# Altium integrated library 00Lib.IntLib: 286 symbols (part 2 of 2)
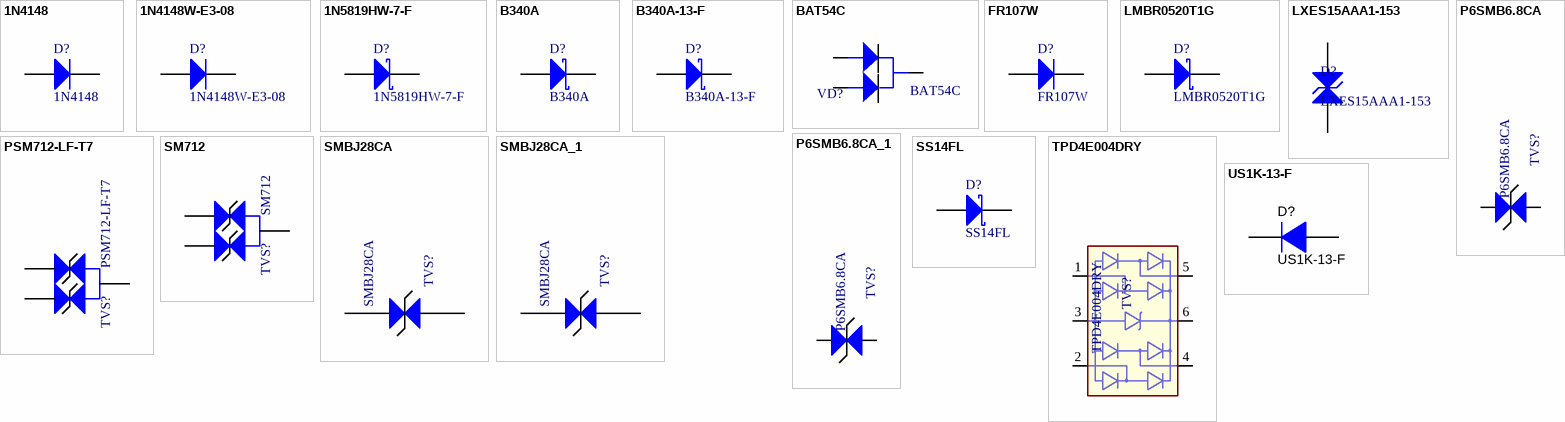
[diagram p14: symbols 1N4148 to US1K-13-F]

## US1K-13-F
designator D?
Diode, Fast Rectifier, 800 V, 1 A, SMA; Manufacturer: Diodes Inc.; U/M: EA; Vf_V: 1.7; Value: 800V; Value1: 1A; Value2: 1.7V; Io_A: 1; Vr_V: 800; TJmax_C: 150; AEC Category: Q101; SymbolVersion: 2008-12-08; PartNumber: US1K-13-F; PackageReference: SMA; CompType: Diode; MountType: SMT; Type: Fast Rectifier; RoHS: Y; Published: 2008-06-26; Publisher: Texas Instruments; LatestRevisionDate: 2015-10-30; ComponentLink1Description: Datasheet link; ComponentLink1URL: http://diodes.com/datasheets/ds16008.pdf; Supplier 1: Digi-Key; Supplier Part Number 1: US1K-FDICT-ND; Supplier 2: Mouser; Supplier Part Number 2: 621-US1K-F; Supplier 3: Newark; Supplier Part Number 3: 12T2263; AEC Qualified: ?
signal-integrity model Diode
footprint SMA
pins: 1 K, 2 A


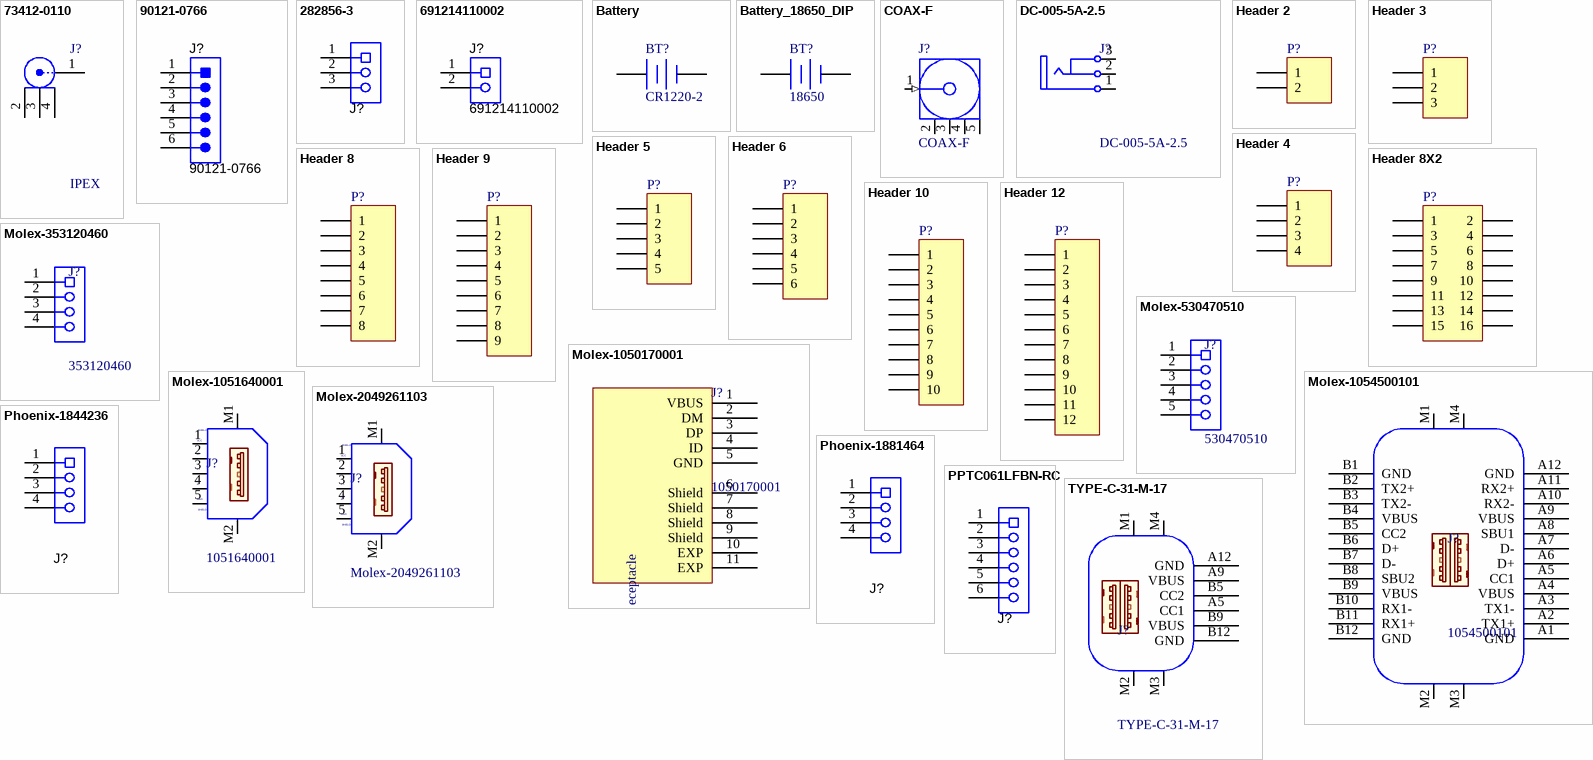
[diagram p7: symbols 73412-0110 to TYPE-C-31-M-17]

## 73412-0110
designator J?, comment IPEX
RF同轴连接器（天线座）; Manufacturer: MOLEX; Code: 734120110; CompType: IPEX插座; DistributorCode: C434806; Package: SMD
footprint molex-73412 (Footprint not found)
pins: 1, 2, 3, 4

## 90121-0766
designator J?
Header, 2.54mm, 6x1, Gold, R/A, TH; Manufacturer: Molex; SymbolCreator: a0412235; Pitch_mm: 2.54; Gender: Male; Shrouded: N; Row_Count: 1; Current_A: 3; Voltage_V: 350; Cert_UL: Y; SymbolVersion: 2013-08-30; PartNumber: 90121-0766; PackageReference: Header, 2.54mm, 6x1, R/A, TH; ClassName: Header; CompType: Header; RoHS: Y; MountType: TH; ComponentLink1Description: Datasheet URL; ComponentLink1URL: http://www.molex.com/pdm_docs/sd/901210766_sd.pdf; Orientation: R/A; PinCount: 6; ContactFinish: Gold; Color: Black; Publisher: Texas Instruments; LatestRevisionDate: 2016-07-28; Supplier 1: Digi-Key; Supplier Part Number 1: WM8112-ND; Supplier 2: Mouser; Supplier Part Number 2: 538-90121-0766; Supplier 3: Farnell; Supplier Part Number 3: 9733477
footprint Molex_90121-0766
pins: 1, 2, 3, 4, 5, 6

## 282856-3
designator J?  (value not drawn)
Receptacle, 3x1, 5mm, R/A, TH; Manufacturer: TE Connectivity; SymbolCreator: a0412235; CompType: Terminal Block; Pitch_mm: 5; Gender: Female; Row_Count: 1; ContactFinish: Tin; Current_A: 24; Voltage_V: 300; Cert_UL: Y; SymbolVersion: 2013-10-03; PartNumber: 282856-3; PackageReference: Receptacle, 3x1, 5mm, R/A, TH; RoHS: Y; MountType: TH; ComponentLink1Description: Datasheet URL; ComponentLink1URL: http://www.te.com/commerce/DocumentDelivery/DDEController?Action=srchrtrv&DocNm=282856&DocType=Customer+Drawing&DocLang=English; Orientation: R/A; PinCount: 3; Color: Green; Publisher: Texas Instruments; LatestRevisionDate: 2016-06-01; Supplier 1: Digi-Key; Supplier Part Number 1: A98356-ND; Supplier 2: Mouser; Supplier Part Number 2: 571-282856-3
footprint TE_282856-3
pins: 1, 2, 3

## 691214110002
designator J?
Terminal Block, 3.5mm, 2x1, Tin, TH; Manufacturer: Wurth Elektronik; Pitch_mm: 3.5; CT: TRUE; CNHeader: FALSE; Voltage_V: 300V; Gender: Female; Cert_UL: Y; Row_Count: 1; Current_A: 10A; Supplier Part Number 1: 732-2747-ND; ContactFinish: Tin; RoHS: Y; Supplier Part Number 3: 710-691214110002; Orientation: Vertical; ComponentLink1Description: Datasheet URL; Supplier 1: Digi-Key; PackageReference: Receptacle, 3.5mm, 2x1, TH; Color: Green; Supplier 2: Newark; PinCount: 2; Publisher: Texas Instruments; CompType: Terminal Block; LatestRevisionDate: 26/05/2017; MountType: TH; PartNumber: 691214110002; Supplier Part Number 2: 16T1479; ComponentLink1URL: http://katalog.we-online.de/em/datasheet/6912141100xx.pdf; Supplier 3: Mouser
footprint Wurth_691214110002 (Receptacle, 3.5mm, 2x1, TH)
pins: 1, 2

## Battery
designator BT?, comment CR1220-2
Multicell Battery; Manufacturer: Q&J; CompType: 电池盒/电池座; Code: CR1220-2; DistributorCode: C70381; Package: 贴片; A_Code: -; A_ComType: -; A_Manufacturer: -
footprint BATTERY-2
pins: 1 +, 2 -

## Battery_18650_DIP
designator BT?, comment 18650
18650单节直插电池仓; Code: DIP-18650; CompType: 电池盒/电池座; DistributorCode: -; Manufacturer: -; Package: DIP; A_Code: -; A_ComType: -; A_Manufacturer: -
footprint BATTERY-2
footprint DIP-18650
pins: 1 +, 2 -

## COAX-F
designator J?
RF天线座 焊板 垂直式/直插; Manufacturer: BAT WIRELESS; Code: BWSMA-KE-Z001MDD; CompType: RF天线座; DistributorCode: C496549; Package: SMA; A_Code: -; A_ComType: -; A_Manufacturer: -
footprint SMA-MCX5.08-H5 (Connector; RF Coaxial, MCX, Thru-Hole; 5 Position; Right-Angle)
pins: 1 Signal (in) "Signal Pin", 2 GND (power), 3 GND (power), 4 GND (power), 5 GND (power)

## DC-005-5A-2.5
designator J?
连接器类型 插孔 / 触点外径 6.5mm / 安装特性 - / 电流额定值 5A / 产品类型 DC电源插座 / 公母 公头 / 安装类型 通孔，直角 / 触点内径 2.5mm / 电压额定值 24V; Manufacturer: XKB Connectivity(中国星坤); CompType: 连接器; Code: DC-005-5A-2.5; DistributorCode: C381115; Package: DC电源插座; A_Code: -; A_ComType: -; A_Manufacturer: -
footprint DC-5.5X2.5
pins: 1 DC+ (power) "Sleeve (Ground)", 2 DC- "Ring/Right Channel/(-)", 3 DC- "Tip/Left Channel/(+)"

## Header 2
designator P?  (value not drawn)
Header, 2-Pin; Code: -; CompType: -; DistributorCode: -; Manufacturer: -; Package: -; A_Code: -; A_ComType: -; A_Manufacturer: -
footprint CP1X2
signal-integrity model Connector
pins: 1, 2

## Header 3
designator P?  (value not drawn)
Header, 3-Pin; Code: -; CompType: -; DistributorCode: -; Manufacturer: -; Package: -; A_Code: -; A_ComType: -; A_Manufacturer: -
footprint CP1X3
signal-integrity model Connector
pins: 1, 2, 3

## Header 4
designator P?  (value not drawn)
Header, 4-Pin; A_Code: -; A_Manufacturer: -; Code: -; DistributorCode: -; Manufacturer: -; Package: -; A_ComType: -; CompType: -
footprint CP1X4 (Connector; Header; 4 Position)
signal-integrity model Connector
pins: 1, 2, 3, 4

## Header 5
designator P?  (value not drawn)
Header, 5-Pin; Code: -; CompType: -; DistributorCode: -; Manufacturer: -; Package: -; A_Code: -; A_ComType: -; A_Manufacturer: -
footprint 1.25mm_p5
signal-integrity model Connector
pins: 1, 2, 3, 4, 5

## Header 6
designator P?
Header, 6-Pin; LatestRevisionDate: 17-Jul-2002; LatestRevisionNote: Re-released for DXP Platform.; Publisher: Altium Limited
footprint CP1X6 (Connector; Header; 6 Position)
signal-integrity model Connector
pins: 1, 2, 3, 4, 5, 6

## Header 8
designator P?  (value not drawn)
Header, 8-Pin; A_Code: -; A_ComType: -; A_Manufacturer: -; Code: -; CompType: -; DistributorCode: -; Manufacturer: -; Package: -
footprint CP1X8 (Connector; Header; 8 Position)
signal-integrity model Connector
pins: 1, 2, 3, 4, 5, 6, 7, 8

## Header 8X2
designator P?  (value not drawn)
Header, 8-Pin, Dual row; A_Code: -; A_ComType: -; A_Manufacturer: -; Code: -; CompType: -; DistributorCode: -; Manufacturer: -; Package: -
footprint CP2X8 (Connector; Header; 8x2 Position)
signal-integrity model Connector
pins: 1, 2, 3, 4, 5, 6, 7, 8, 9, 10, 11, 12, 13, 14, 15, 16

## Header 9
designator P?  (value not drawn)
Header, 9-Pin; Code: -; CompType: -; DistributorCode: -; Manufacturer: -; Package: -; A_Code: -; A_ComType: -; A_Manufacturer: -
footprint CP1X9
signal-integrity model Connector
pins: 1, 2, 3, 4, 5, 6, 7, 8, 9

## Header 10
designator P?  (value not drawn)
Header, 10-Pin; Code: -; CompType: -; DistributorCode: -; Manufacturer: -; Package: -; A_Code: -; A_ComType: -; A_Manufacturer: -
footprint CP1X10
signal-integrity model Connector
pins: 1, 2, 3, 4, 5, 6, 7, 8, 9, 10

## Header 12
designator P?  (value not drawn)
Header, 12-Pin; A_ComType: -; A_Code: -; A_Manufacturer: -; Code: -; CompType: -; DistributorCode: -; Manufacturer: -; Package: -
footprint CP1X12 (Connector; Header; 12 Position)
signal-integrity model Connector
pins: 1, 2, 3, 4, 5, 6, 7, 8, 9, 10, 11, 12

## Molex-353120460
designator J?, comment 353120460
2.5mmx4; Manufacturer: MOLEX; CompType: 连接器; Code: 353120460; DistributorCode: C185200; Package: P=2.5mm; A_Code: -; A_ComType: -; A_Manufacturer: -
footprint molex-353120460_sd
pins: 1, 2, 3, 4

## Molex-530470510
designator J?, comment 530470510
MX1.25 直插 镀锡 5P 针座; Manufacturer: MOLEX; CompType: 连接器; Code: 530470510; DistributorCode: C471412; Package: 1.25mm 5p; A_Code: -; A_ComType: -; A_Manufacturer: -
footprint 1.25mm_p5
pins: 1, 2, 3, 4, 5

## Molex-1050170001
designator J?, comment 1050170001
USB连接器; Manufacturer: MOLEX; CompType: 连接器; Code: 1050170001; DistributorCode: C136000; Package: MicroUSB; A_Code: -; A_ComType: -; A_Manufacturer: -
footprint CON_USBMICROB_MOLEX_105017-0001_H2P90
pins: 1 VBUS, 2 DM, 3 DP, 4 ID, 5 GND, 6 Shield, 7 Shield, 8 Shield, 9 Shield, 10 EXP, 11 EXP
text: USB_Micro-B receptacle

## Molex-1051640001
designator J?, comment 1051640001
USB连接器; Manufacturer: MOLEX; CompType: 连接器; Code: 1051640001; DistributorCode: C234179; Package: MicroUSB; A_Code: -; A_ComType: -; A_Manufacturer: -
footprint MOLEX_1051640001_B2N
pins: 1 VCC (power), 2 D-, 3 D+, 4 ID, 5 GND (power), M1 SHIELD1 (power), M2 SHIELD2 (power)
text: SHIELD

## Molex-1054500101
designator J?, comment 1054500101
USB连接器USB-typeC-24; Manufacturer: MOLEX; CompType: 连接器; Code: 1054500101; DistributorCode: C134092; Package: USB-typeC-24; A_Code: -; A_ComType: -; A_Manufacturer: -
footprint Type_C-CONN24_1054500101
pins: A1 GND, A2 TX1+, A3 TX1-, A4 VBUS, A5 CC1, A6 D+, A7 D-, A8 SBU1, A9 VBUS, A10 RX2-, A11 RX2+, A12 GND, B1 GND, B2 TX2+, B3 TX2-, B4 VBUS, B5 CC2, B6 D+, B7 D-, B8 SBU2, B9 VBUS, B10 RX1-, B11 RX1+, B12 GND, M1 SHIELD (power), M2 SHIELD (power), M3 SHIELD (power), M4 SHIELD (power)

## Molex-2049261103
designator J?
USB连接器; Manufacturer: MOLEX; CompType: 连接器; Code: 2049261103; DistributorCode: C585464; Package: MicroUSB; A_Code: -; A_ComType: -; A_Manufacturer: -
footprint MOLEX-204926
pins: 1 VCC (power), 2 D-, 3 D+, 4 ID, 5 GND (power), M1 SHIELD1 (power), M2 SHIELD2 (power)
text: SHIELD

## Phoenix-1844236
designator J?, comment 1844236  (value not drawn)
印刷线路板壳体， 额定横截面: 1.5 mm²， 颜色: 绿色， 标称工作电流: 8 A， 额定电压(III/2): 160 V， 触点表面: 锡， 触点类型: 针式连接器， 电位数: 4， 行数: 1， 每行位数: 4， 连接量: 4， 产品系列: MC 1,5/..-G， 针距: 3.5 mm， 安装: 波峰焊， 针脚排列: 直线排列， 焊针[P]: 3.4 mm; Manufacturer: Phoenix Contact(菲尼克斯); CompType: 连接器; Code: 1844236; DistributorCode: C480590; Package: P=3.5mm
footprint pxc_1844236_05_MC-1-5-4-G-3-5
pins: 1, 2, 3, 4

## Phoenix-1881464
designator J?, comment 1881464  (value not drawn)
印刷线路板壳体， 额定横截面: 0.5 mm²， 颜色: 绿色， 标称工作电流: 4 A， 额定电压(III/2): 160 V， 触点表面: 锡， 触点类型: 针式连接器， 电位数: 4， 行数: 1， 每行位数: 4， 连接量: 4， 产品系列: MC 0,5/..-G， 针距: 2.5 mm， 安装: 波峰焊， 导线／PCB连接方向: 0 °， 针脚排列: 直线排列， 焊针[P]: 3.8 mm; Manufacturer: Phoenix Contact(菲尼克斯); CompType: 连接器; Code: 1881464; DistributorCode: C480575; Package: P=2.5mm
footprint pxc_1881464_00_MC-0-5-4-G-2-5
pins: 1, 2, 3, 4

## PPTC061LFBN-RC
designator J?  (value not drawn)
Receptacle, 100mil, 6x1, Tin, TH; Manufacturer: Sullins Connector Solutions; CNHeader: FALSE; Current_A: 3A; Gender: Female; Voltage_V: 250V; CompType: Socket Strip; Pitch_mm: 2.54; CT: TRUE; Cert_UL: Y; ComponentLink1URL: http://www.sullinscorp.com/drawings/78_P(N)PxCxxxLFBN-RC,_10492-G.pdf; Publisher: Texas Instruments; Color: Black; RoHS: Y; MountType: TH; Supplier 1: Digi-Key; PackageReference: Receptacle, 6x1, 2.54mm, Female, TH; LatestRevisionDate: 26/05/2017; PartNumber: PPTC061LFBN-RC; ComponentLink1Description: Datasheet URL; Supplier Part Number 1: S7004-ND; ContactFinish: Tin
footprint Sullins_PPTC061LFBN-RC (Receptacle, 6x1, 2.54mm, Female, TH)
pins: 1, 2, 3, 4, 5, 6

## TYPE-C-31-M-17
designator J?
USB连接器USB-typeC-6; Manufacturer: 韩国韩荣; CompType: 连接器; Code: TYPE-C-31-M-17; DistributorCode: C283540; Package: USB-typeC-6; A_Code: -; A_ComType: -; A_Manufacturer: -
footprint Type_C-6P
pins: A5 CC1, A9 VBUS, A12 GND, B5 CC2, B9 VBUS, B12 GND, M1 SHIELD (power), M2 SHIELD (power), M3 SHIELD (power), M4 SHIELD (power)


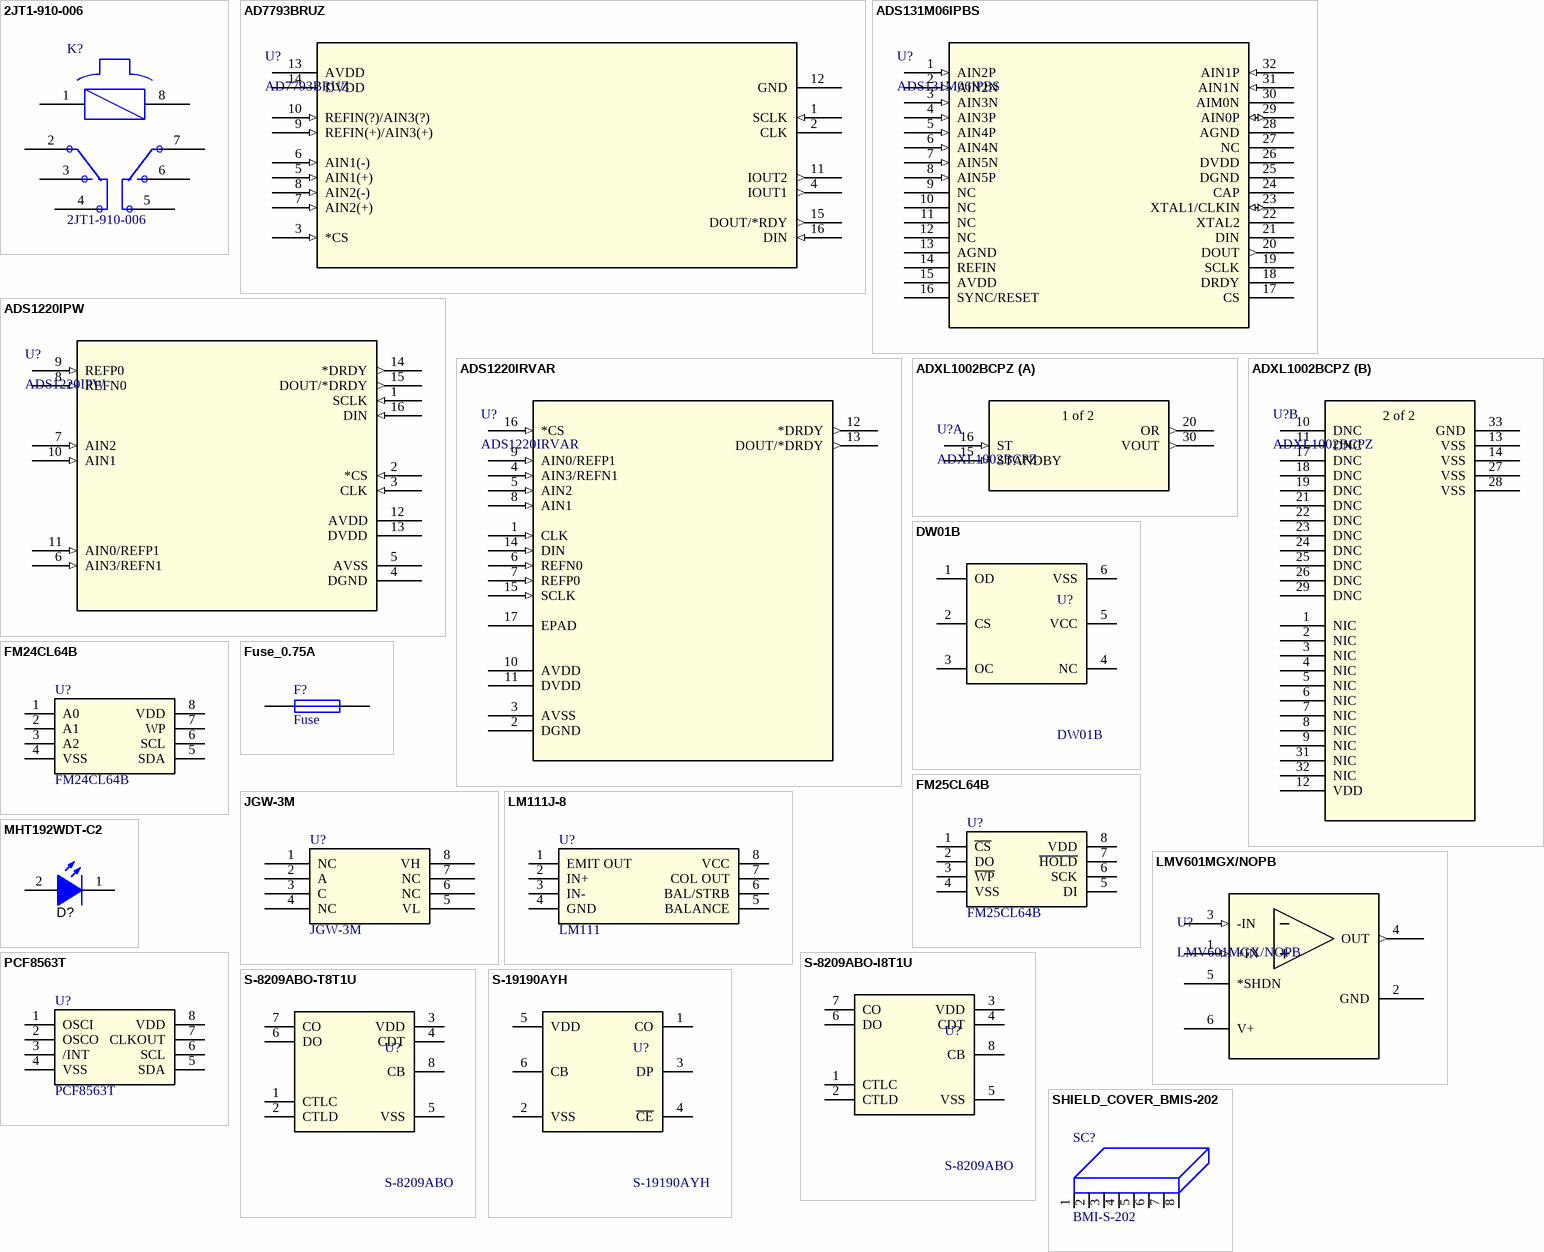
[diagram p8: symbols 2JT1-910-006 to SHIELD_COVER_BMIS-202]

## 2JT1-910-006
designator K?
线圈电阻98Ω，动作电压4.5~5.2V; CompType: 密封电磁继电器; Manufacturer: -; DistributorCode: -; Code: 2JT1-910-006; Package: TO-5; A_Code: -; A_Manufacturer: -; A_ComType: -
footprint TO-5
pins: 1, 2, 3, 4, 5, 6, 7, 8

## AD7793BRUZ
designator U?
模数转换芯片; Manufacturer: ADI(亚德诺); Code: AD7793BRUZ; A_Code: -; A_ComType: -; A_Manufacturer: -; CompType: 模数转换芯片; DistributorCode: C578522; Package: TSSOP-16
footprint RU_16
pins: 1 SCLK (in), 2 CLK, 3 *CS (in), 4 IOUT1 (out), 5 AIN1(+) (in), 6 AIN1(-) (in), 7 AIN2(+) (in), 8 AIN2(-) (in), 9 REFIN(+)/AIN3(+) (in), 10 REFIN(?)/AIN3(?) (in), 11 IOUT2 (out), 12 GND, 13 AVDD (power), 14 DVDD (power), 15 DOUT/*RDY (out), 16 DIN (in)

## ADS131M06IPBS
designator U?
-; Manufacturer: TI(德州仪器); CompType: 模数转换芯片; Code: ADS131M06IPBS; DistributorCode: -; Package: TSSOP-16; A_Code: -; A_ComType: -; A_Manufacturer: -
footprint QFP_06IPBS_TEX-L
pins: 1 AIN2P (in), 2 AIN2N (in), 3 AIN3N (in), 4 AIN3P (in), 5 AIN4P (in), 6 AIN4N (in), 7 AIN5N (in), 8 AIN5P (in), 9 NC, 10 NC, 11 NC, 12 NC, 13 AGND, 14 REFIN, 15 AVDD (power), 16 SYNC/RESET, 17 CS, 18 DRDY, 19 SCLK, 20 DOUT (out), 21 DIN, 22 XTAL2, 23 XTAL1/CLKIN (io), 24 CAP, 25 DGND, 26 DVDD (power), 27 NC, 28 AGND, 29 AIN0P (io), 30 AIM0N, 31 AIN1N (in), 32 AIN1P (in)

## ADS1220IPW
designator U?
模数转换芯片 / 读写接口类型 SPI / 工作电压 2.3V~5.5V / 输入类型 Differential, Single Ended / 参考类型 External, Internal / 输入数 2,4 / 采样率（sps） 2K / A/D 位数 24; Manufacturer: TI(德州仪器); Code: ADS1220IPW; CompType: 模数转换芯片; DistributorCode: C48263; Package: TSSOP-16; A_Code: -; A_ComType: -; A_Manufacturer: -
footprint PW16
pins: 1 SCLK (in), 2 *CS (in), 3 CLK (in), 4 DGND (power), 5 AVSS (power), 6 AIN3/REFN1 (in), 7 AIN2 (in), 8 REFN0 (in), 9 REFP0 (in), 10 AIN1 (in), 11 AIN0/REFP1 (in), 12 AVDD (power), 13 DVDD (power), 14 *DRDY (out), 15 DOUT/*DRDY (out), 16 DIN (in)

## ADS1220IRVAR
designator U?
模数转换芯片 / 读写接口类型 SPI / 工作电压 2.3V~5.5V / 输入类型 Differential, Single Ended / 参考类型 External, Internal / 输入数 2,4 / 采样率（sps） 2K / A/D 位数 24; Manufacturer: TI(德州仪器); Code: ADS1220IRVAR; CompType: 模数转换芯片; DistributorCode: C48263; Package: VFQFN-16
footprint RVA16_2P14X2P14
pins: 1 CLK (in), 2 DGND (power), 3 AVSS (power), 4 AIN3/REFN1 (in), 5 AIN2 (in), 6 REFN0 (in), 7 REFP0 (in), 8 AIN1 (in), 9 AIN0/REFP1 (in), 10 AVDD (power), 11 DVDD (power), 12 *DRDY (out), 13 DOUT/*DRDY (out), 14 DIN (in), 15 SCLK (in), 16 *CS (in), 17 EPAD

## ADXL1002BCPZ
designator U?
Manufacturer: ADI(亚德诺); CompType: 加速度计; DistributorCode: C579442; Code: ADXL1002BCPZ; Package: LFCSP-32
footprint CP-32-26_ADI
part A pins: 15 STANDBY (in), 16 ST (in), 20 OR (out), 30 VOUT (out)
part B pins: 1 NIC, 2 NIC, 3 NIC, 4 NIC, 5 NIC, 6 NIC, 7 NIC, 8 NIC, 9 NIC, 10 DNC, 11 DNC, 12 VDD (power), 13 VSS, 14 VSS, 17 DNC, 18 DNC, 19 DNC, 21 DNC, 22 DNC, 23 DNC, 24 DNC, 25 DNC, 26 DNC, 27 VSS, 28 VSS, 29 DNC, 31 NIC, 32 NIC, 33 GND
part A text: 1 of 2
part B text: 2 of 2

## DW01B
designator U?
Manufacturer: BLUE ROCKET(蓝箭); CompType: 电池保护芯片; Code: DW01B; DistributorCode: C305480; Package: SOT23-6
footprint USOT23-6
pins: 1 OD, 2 CS, 3 OC, 4 NC (power), 5 VCC (power), 6 VSS (hiz)

## FM24CL64B
designator U?
存储器构架(格式) FRAM / 存储器接口类型 I2C / 存储器容量 64Kb (8K x 8) / 工作电压 3V ~ 3.6V / 存储器类型 Non-Volatile; Manufacturer: CYPRESS(赛普拉斯); Code: FM24CL64B-GTR; CompType: FRAM存储器; DistributorCode: C9829; Package: SOIC-8; A_Code: -; A_ComType: -; A_Manufacturer: -
footprint SOP-8_150mil
footprint D8_TEX
pins: 1 A0 (power), 2 A1 (power), 3 A2 (power), 4 VSS, 5 SDA, 6 SCL, 7 WP, 8 VDD

## FM25CL64B
designator U?
存储器构架(格式) FRAM / 存储器接口类型 SPI / 存储器容量 64Kb (8K x 8) / 工作电压 2.7V ~ 3.65V / 存储器类型 Non-Volatile; Manufacturer: CYPRESS(赛普拉斯); Code: FM25CL64B-GTR; CompType: FRAM存储器; DistributorCode: C9830; Package: SOIC-8; A_Code: -; A_ComType: -; A_Manufacturer: -
footprint SOP-8_150mil
footprint D8_TEX
pins: 1 ~{CS} (power), 2 DO (power), 3 ~{WP} (power), 4 VSS, 5 DI, 6 SCK, 7 ~{HOLD}, 8 VDD

## Fuse_0.75A
designator F?, comment Fuse
额定电流0.75A;额定电压125V;L*W=6.1*2.69mm;-55℃～125℃; Manufacturer: Littelfuse; Code: 0451.750MRL; CompType: 表贴快断型一次熔断保险管; Revision: July-2002: Re-released for DXP Platform.; DistributorCode: C151117; Package: SMF_045X; A_Code: -; A_ComType: -; A_Manufacturer: -
footprint FUSE
pins: 1, 2

## JGW-3M
designator U?
固态继电器; Manufacturer: 中国航天; Code: JGW-3M/SMD/Y; DistributorCode: -; Package: SMD-8_9.0MM; A_Code: -; A_Manufacturer: -; CompType: 固态继电器; A_ComType: -
footprint SMD-8_9.0MM
footprint SMD-8_9.0MM
pins: 1 NC, 2 A, 3 C, 4 NC, 5 VL, 6 NC, 7 NC, 8 VH

## LM111J-8
designator U?, comment LM111
比较器; Manufacturer: NS; Code: LM111J; DistributorCode: -; Package: CDIP(8); A_Code: -; A_Manufacturer: -; CompType: 比较器; A_ComType: -
footprint DIP-8_L9.7-W6.4-P2.54-LS7.6-BL
pins: 1 EMIT OUT (power), 2 IN+ (power), 3 IN- (power), 4 GND, 5 BALANCE, 6 BAL/STRB, 7 COL OUT, 8 VCC

## LMV601MGX/NOPB
designator U?
运算放大器; Manufacturer: TI(德州仪器); CompType: 运放; DistributorCode: C470960; Package: SC-70-6; Code: LMV601MGX/NOPB
footprint DCK6_TEX-L
pins: 1 +IN (in), 2 GND (power), 3 -IN (in), 4 OUT (out), 5 *SHDN, 6 V+ (power)

## MHT192WDT-C2
designator D?  (value not drawn)
LED SMD贴片0603顶部发光 / 黄色雾状胶体，高亮白色光 / 电压VF:2.6-3.1V@5mA / 亮度Iv:228-450mcd@5mA / 坐标x:0.3,y:0.3 / 发光角度:120deg; Manufacturer: MEIHUA(美华科技); CompType: LED; Code: MHT192WDT-C2; Package: 0603; DistributorCode: C389521; A_Code: -; A_ComType: -; A_Manufacturer: -
footprint LED0603
pins: 1 K, 2 A

## PCF8563T
designator U?
电压 - 电源：1.8 V ~ 5.5 V / 电流 - 计时（最大）：0.6μA ~ 0.75μA @ 2V ~ 5V / 工作温度：-40°C ~ 85°C; Manufacturer: NXP(恩智浦); Code: PCF8563T/5,518; CompType: 实时时钟芯片; DistributorCode: C7440; Package: SOIC-8; A_Code: -; A_ComType: -; A_Manufacturer: -
footprint D8_TEX
pins: 1 OSCI (power), 2 OSCO (power), 3 /INT (power), 4 VSS, 5 SDA, 6 SCL, 7 CLKOUT, 8 VDD

## S-8209ABO-I8T1U
designator U?, comment S-8209ABO
均衡电压4.175V;过充电压4.25V-4.1V; Manufacturer: 艾普凌科; Code: S-8209ABO-I8T1U; CompType: 电池保护芯片; DistributorCode: -; Package: SNT-8A
footprint TSSOP-8
footprint SNT-8A
pins: 1 CTLC, 2 CTLD, 3 VDD, 4 CDT (power), 5 VSS (power), 6 DO (hiz), 7 CO, 8 CB

## S-8209ABO-T8T1U
designator U?, comment S-8209ABO
均衡电压4.175V;过充电压4.25V-4.1V; Manufacturer: 艾普凌科; Code: S-8209ABO-T8T1U; CompType: 电池保护芯片; DistributorCode: -; Package: TSSOP-8
footprint TSSOP-8
pins: 1 CTLC, 2 CTLD, 3 VDD, 4 CDT (power), 5 VSS (power), 6 DO (hiz), 7 CO, 8 CB

## S-19190AYH
designator U?
均衡电压4.15V;过充电压4.275V; Manufacturer: 艾普凌科; CompType: 电池保护芯片; Code: S-19190AYH; DistributorCode: -; Package: SOT23-6
footprint USOT23-6
pins: 1 CO, 2 VSS, 3 DP, 4 ~{CE} (power), 5 VDD (power), 6 CB (hiz)

## SHIELD_COVER_BMIS-202
designator SC?, comment BMI-S-202
BMI-S-202-F：EMI垫片、金属薄片、吸收片和屏蔽片 SBS,FRAM,TnR 3.60x16.50x16.50MM / BMI-S-202-C：EMI垫片、金属薄片、吸收片和屏蔽片 SBS,COVR,BP 2.00x16.96x16.96MM; Manufacturer: Laird Technologies EMI; Code: BMI-S-202-C(罩子)BMI-S-202-F（骨架）; CompType: SHIELD; Package: BMI-S-202; DistributorCode: Mouser 零件编号：739-BMI-202-C和739-BMI-202-F; A_Code: -; A_ComType: -; A_Manufacturer: -
footprint MECH_BMIS202N
pins: 1 GND (power), 2 GND (power), 3 GND (power), 4 GND (power), 5 GND (power), 6 GND (power), 7 GND (power), 8 GND (power)

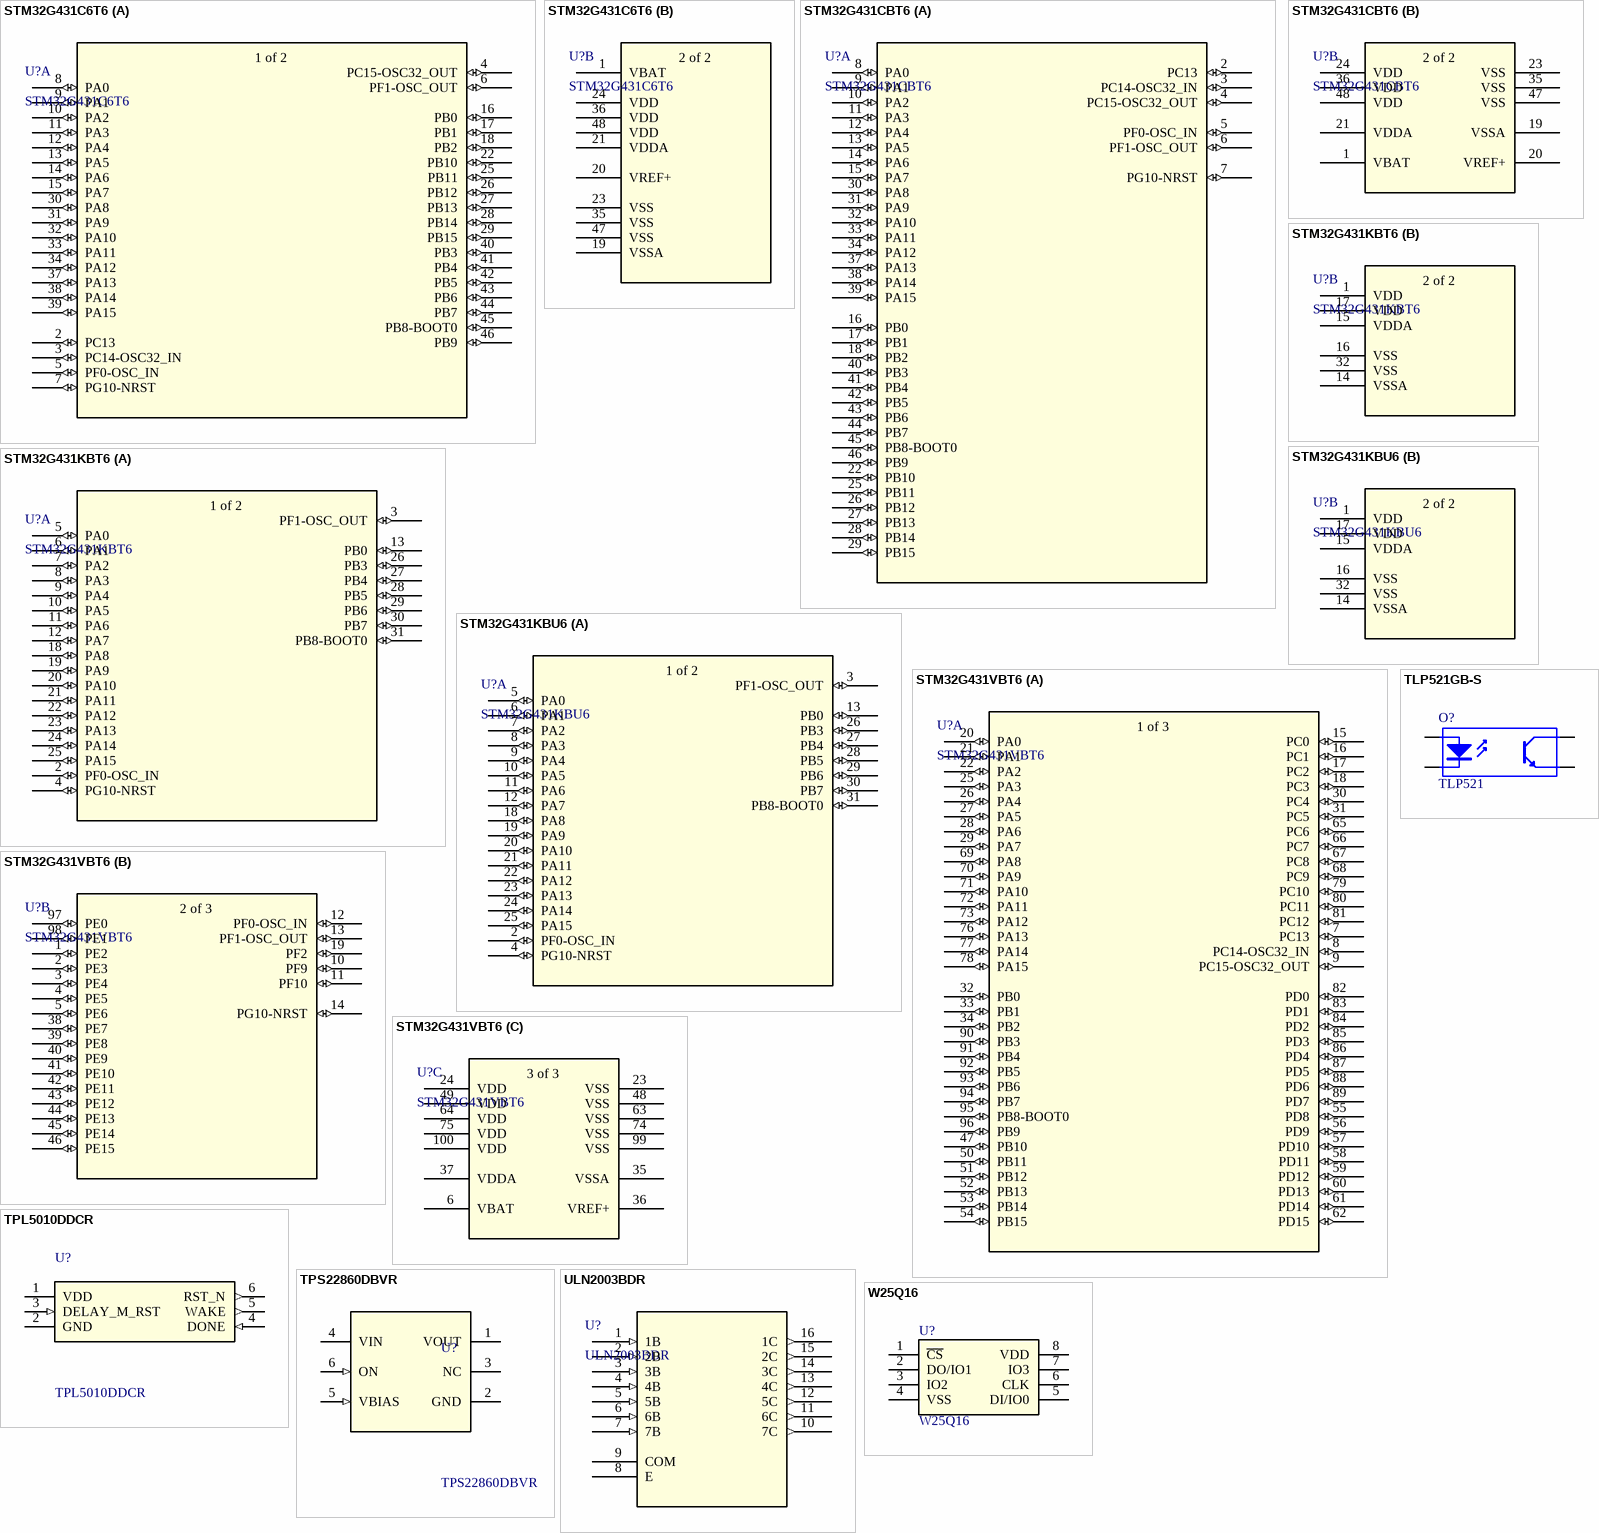
[diagram p9: symbols STM32G431C6T6 to W25Q16]
